# Altium footprint library Connectors.PcbLib: 117 footprints (part 8 of 8)
Each footprint in its own frame and in the unit in brackets; x right, y up, seen from the top. Pads: shape width x height; smd on the part's side, far side on the other; paste and mask are expansions set on the pad; w line width, h text height; cw(c..) or ccw(c..) is an arc to the next point about the centre after c.
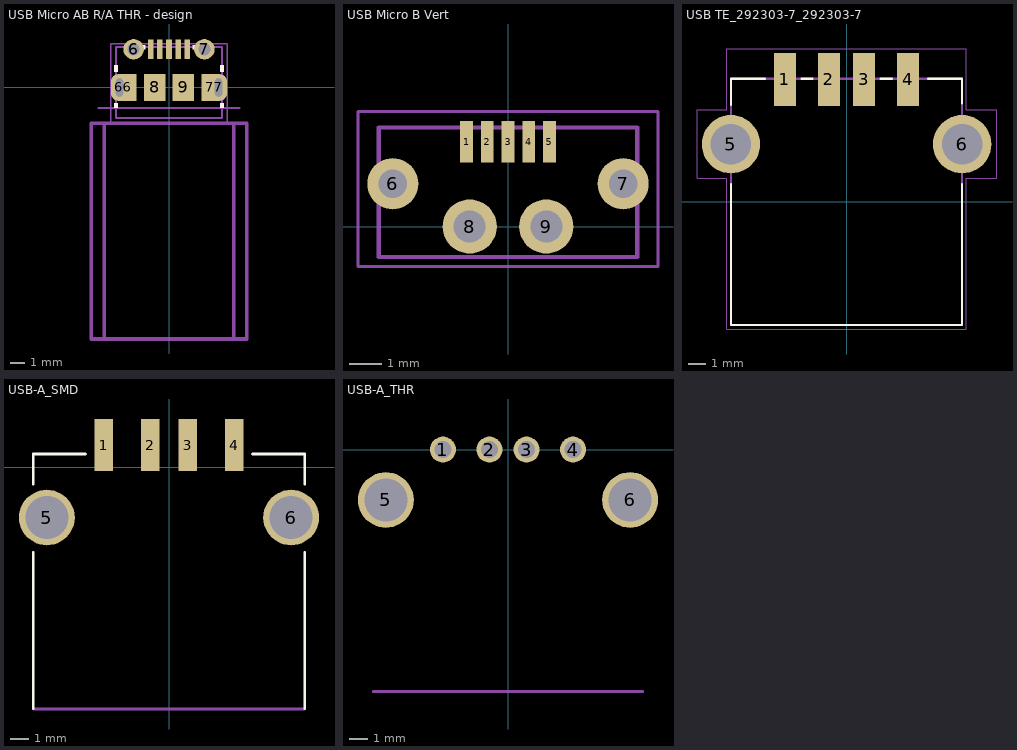
[diagram p7: the footprints below, top view; thin cyan lines are the x and y axes]

## USB Micro AB R/A THR - design [mm] "USB Micro AB R/A Through Hole"
height 2.8
pads (13):
  rect 0.4x1.35 smd: 1(-1.3,2.7) 2(-0.65,2.7) 3(0,2.7) 4(0.65,2.7) 5(1.3,2.7)
  rrect90% 1.2x1.9 hole 0.5 slot 1.3 at 90 deg: 6(-3.5,0) 7(3.5,0)
  rect 1.2x1.9 smd: 6(-2.9,0) 7(2.9,0)
  round 1.45 hole 0.85 mask+0.102: 6(-2.5,2.7) 7(2.5,2.7)
  rect 1.5x1.9 smd: 8(-1,0) 9(1,0)
Top Overlay:
  region: 3.9,-1.1 3.6,-1.1 3.6,-1.45 3.9,-1.45
  region: -3.6,-1.1 -3.9,-1.1 -3.9,-1.45 -3.6,-1.45
  rectangle: 3.6,1.1 3.9,1.6
  rectangle: -3.9,1.1 -3.6,1.6
  region: -1.65,3 -1.9,3 -1.9,2.7 -1.65,2.7
  region: 1.9,3 1.65,3 1.65,2.7 1.9,2.7
Top Paste:
  circle w0.7: c-2.5,2.7 r0.35
  circle w0.7: c2.5,2.7 r0.35
  circle w0.7: c-3.55,0.4 r0.2
  circle w0.7: c-3.55,-0.4 r0.2
  circle w0.7: c3.55,0.4 r0.2
  circle w0.7: c3.55,-0.4 r0.2
  rectangle: -4.1,-0.4 -3.35,0.45
  region: 4.1,0.4 3.35,0.4 3.35,-0.45 4.1,-0.45
Mechanical 13:
  lines w0.1: -4.1,-2.5 4.1,-2.5
  lines w0.127: -5,-1.45 5,-1.45 ; -3.75,-2.15 3.75,-2.15 3.75,2.85 -3.75,2.85 -3.75,-2.15
  lines w0.254: -5.5,-17.78 5.5,-17.78 5.5,-2.54 -5.5,-2.54 -5.5,-17.78 ; -4.572,-17.78 4.572,-17.78 4.572,-2.54 -4.572,-2.54 -4.572,-17.78
Mechanical 15:
  lines w0.1: -4.1,-2.5 -4.1,3.1 4.1,3.1 4.1,-2.5
3D body "10118194c.step": height 2.69, standoff -0.59, extent -4.025,-2.655 4.025,2.925
3D body "USBFIREWIRE_COM-MCBS.step": height 5.28, standoff -2.72, extent -6,-28.555 6,1.045

## USB Micro B Vert [mm] "USB Micro B Vertical Mount"
height 2.8
pads (9):
  rect 0.4x1.3 smd: 1(-1.3,2.65) 2(-0.65,2.65) 3(0,2.65) 4(0.65,2.65) 5(1.3,2.65)
  round 1.6 hole 0.9: 6(-3.61,1.34) 7(3.61,1.34)
  round 1.7 hole 1: 8(-1.2,0) 9(1.2,0)
Mechanical 13:
  lines w0.127: -4.05,-0.95 4.05,-0.95 4.05,3.1 -4.05,3.1 -4.05,-0.95
Mechanical 15:
  lines w0.1: -4.7,-1.25 -4.7,3.6 4.7,3.6 4.7,-1.25 -4.7,-1.25
3D body "ZX80-B-5P.stp": height 7.31, standoff -0.69, extent -4.039,-0.95 4.039,3.1
3D body "USBFIREWIRE_COM-MCBS.step": height 33.17, standoff 3.58, extent -6,-2.901 6,5.099

## USB TE_292303-7_292303-7 [mm]
pads (6):
  rect 1.25x3 smd: 1(-3.5,6.96) 2(-1,6.96) 3(1,6.96) 4(3.5,6.96)
  round 3.316 hole 2.3: 5(-6.57,3.28) 6(6.57,3.28)
Top Overlay:
  lines w0.127: -6.565,1 -6.565,-7 6.565,-7 6.565,1 ; -6.565,5.5 -6.565,7 -4.635,7 ; -2.565,7 -1.935,7 ; 1.935,7 2.565,7 ; 4.635,7 6.565,7 6.565,5.6
Mechanical 13:
  lines w0.127: -6.565,-7 -6.565,7 6.565,7 6.565,-7 -6.565,-7
Mechanical 15:
  lines w0.05: -8.5,1.33 -8.5,5.23 -6.815,5.23 -6.815,8.71 6.815,8.71 6.815,5.23 8.55,5.23 8.55,1.33 6.815,1.33 6.815,-7.25 -6.815,-7.25 -6.815,1.33 -8.5,1.33
3D body "c-292303-7-e-3d.stp": height 7.77, standoff -3.59, extent -8.115,-7 8.117,8.16
3D body "www USBFireWire com-AS-DEFAULT.STEP": height 8.15, standoff 0.15, extent -7.73,-49.54 7.73,1.87

## USB-A_SMD [mm] "USB Type A SMD R/A"
pads (6):
  rect 1x2.8 smd: 1(-3.5,1.19) 2(-1,1.19) 3(1,1.19) 4(3.5,1.19)
  round 3 hole 2.3: 5(-6.57,-2.71) 6(6.57,-2.71)
Top Overlay:
  lines w0.152: -7.3,-13 -7.3,-4.6 ; -7.3,-0.9 -7.3,0.7 -4.5,0.7 ; 4.5,0.7 7.3,0.7 7.3,-0.9 ; 7.3,-13 7.3,-4.6
Mechanical 1:
  lines w0.152: -7.25,-13.01 7.25,-13.01
3D body "User Library-USB Socket.STEP": height 7.22, standoff -0.81, extent -7.3,-13.54 7.3,0.69

## USB-A_THR [mm] "USB Type A Through Hole R/A"
pads (6):
  round 1.4 hole 0.92: 1(-3.5,0) 2(-1,0) 3(1,0) 4(3.5,0)
  round 3 hole 2.3: 5(-6.57,-2.71) 6(6.57,-2.71)
Mechanical 1:
  lines w0.152: -7.25,-13.01 7.25,-13.01
3D body "User Library-USB Socket.STEP": height 7.22, standoff -0.81, extent -7.3,-13.54 7.3,0.69
3D body "www USBFireWire com-AS-DEFAULT.STEP": height 7.7, standoff -0.3, extent -7.73,-55.53 7.73,-4.12